# Altium footprint library smdComponent.PcbLib: 182 footprints (part 5 of 12)
Each footprint in its own frame and in the unit in brackets; x right, y up, seen from the top. Pads: shape width x height; smd on the part's side, far side on the other; paste and mask are expansions set on the pad; w line width, h text height; cw(c..) or ccw(c..) is an arc to the next point about the centre after c.
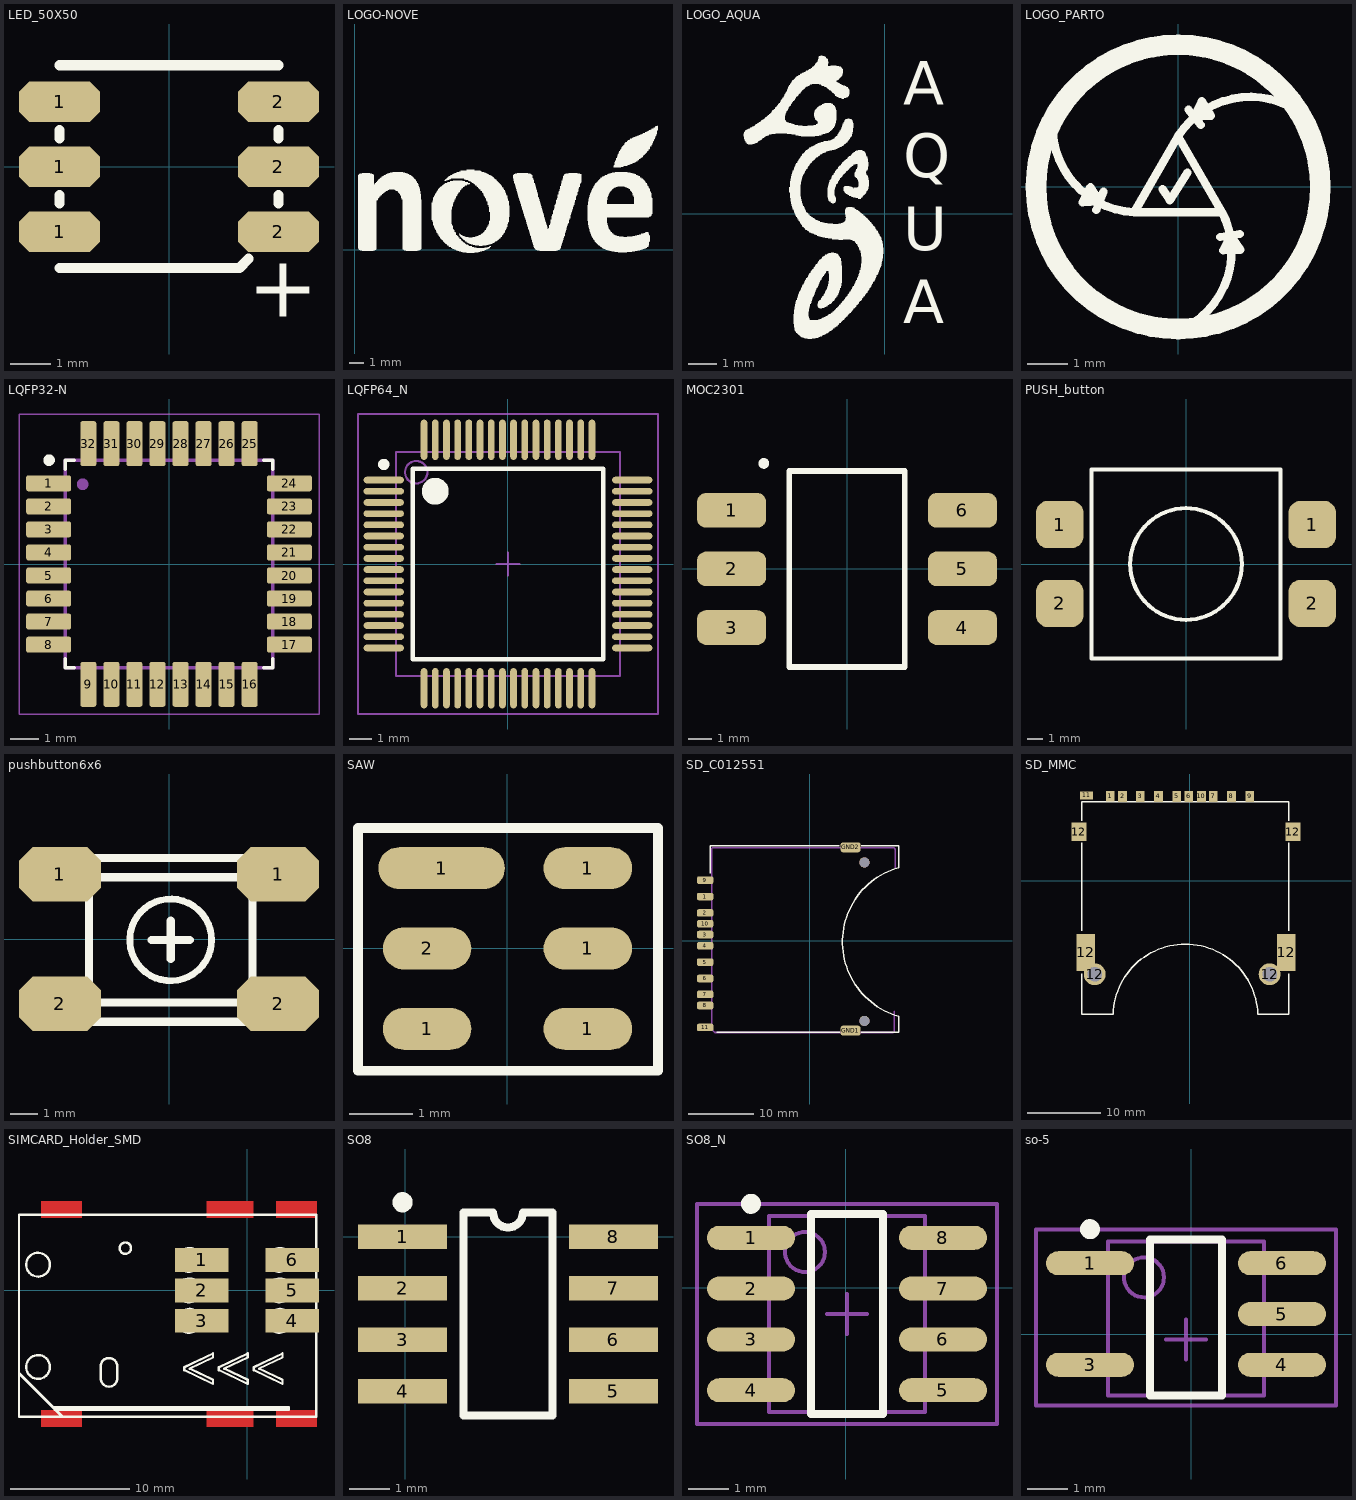
[diagram p4: the footprints below, top view; thin cyan lines are the x and y axes]

## LED_50X50 [mm] "SMD"
pads (6):
  oct 2x1 smd: 1(-2.7,-1.6) 1(-2.7,0) 1(-2.7,1.6) 2(2.7,-1.6) 2(2.7,0) 2(2.7,1.6)
Top Overlay:
  lines w0.254: -2.7,-2.5 1.734,-2.5 1.961,-2.273 ; -2.7,-0.9 -2.7,-0.7 ; -2.7,0.7 -2.7,0.9 ; -2.7,2.5 2.7,2.5 ; 2.7,-0.9 2.7,-0.7 ; 2.7,0.7 2.7,0.9
  text "+" at 1.946,-3.7 h1.52
3D body "LED_50X50.STEP": height 1.5, standoff -0.2, extent -2.708,-2.475 2.642,2.475

## LOGO-NOVE [mm]
Top Overlay:
  drawing of 1593 lines, arcs and shapes, not listed

## LOGO_AQUA [mm]
Top Overlay:
  drawing of 3 lines, arcs and shapes, not listed
  text "A" at 0.635,3.81 h1.52
  text "Q" at 0.635,1.27 h1.52
  text "U" at 0.635,-1.27 h1.52
  text "A" at 0.635,-3.81 h1.52

## LOGO_PARTO [mm]
Top Overlay:
  circle w0.508: c0,0 r3.5
  lines w0.203: -3.088,1.59 ccw(c-0.978,1.485) -1.083,-0.625 ; -2.013,-0.568 -1.836,-0.113 ; -0.387,-0.055 -0.203,-0.33 0.229,0.356 ; 0.167,-3.469 ccw(c-0.797,-1.59) 1.083,-0.625 ; 0.254,1.905 0.559,1.524 ; 1.038,-1.233 1.52,-1.16 ; 2.921,1.88 ccw(c1.775,0.104) 0,1.25 ; -1.083,-0.625 1.083,-0.625 ; -1.083,-0.625 0,1.25 ; 0,1.25 1.083,-0.625 ; -2.354,-0.383 -1.93,-0.356 -2.161,-0.008 -2.354,-0.383 ; 0.396,1.727 0.813,1.753 0.584,2.108 0.396,1.727 ; 1.109,-1.567 1.531,-1.547 1.295,-1.194 1.109,-1.567

## LQFP32-N [mm]
pads (32):
  rrect25% 1.56x0.55 smd: 1(-4.18,2.8) 2(-4.18,2) 3(-4.18,1.2) 4(-4.18,0.4) 5(-4.18,-0.4) 6(-4.18,-1.2) 7(-4.18,-2) 8(-4.18,-2.8) 17(4.18,-2.8) 18(4.18,-2) 19(4.18,-1.2) 20(4.18,-0.4) 21(4.18,0.4) 22(4.18,1.2) 23(4.18,2) 24(4.18,2.8)
  rrect25% 0.55x1.56 smd: 9(-2.8,-4.18) 10(-2,-4.18) 11(-1.2,-4.18) 12(-0.4,-4.18) 13(0.4,-4.18) 14(1.2,-4.18) 15(2,-4.18) 16(2.8,-4.18) 25(2.8,4.18) 26(2,4.18) 27(1.2,4.18) 28(0.4,4.18) 29(-0.4,4.18) 30(-1.2,4.18) 31(-2,4.18) 32(-2.8,4.18)
Top Overlay:
  circle w0.2: c-4.166,3.607 r0.1
  lines w0.127: -3.6,-3.3 -3.6,-3.6 -3.3,-3.6 ; -3.6,3.3 -3.6,3.6 -3.3,3.6 ; 3.3,-3.6 3.6,-3.6 3.6,-3.3 ; 3.3,3.6 3.6,3.6 3.6,3.3
Mechanical 13:
  circle w0.2: c-3,2.77 r0.1
  lines w0.127: -3.6,-3.6 3.6,-3.6 3.6,3.6 -3.6,3.6 -3.6,-3.6
Mechanical 15:
  lines w0.05: -5.21,-5.21 5.21,-5.21 5.21,5.21 -5.21,5.21 -5.21,-5.21
3D body "User Library-LQFP32.STEP": height 1.63, standoff -0.09, extent -4.496,-4.525 4.504,4.475

## LQFP64_N [mm] "for stm32f103"
pads (64):
  oval 1.8x0.3 smd: 1(-5.55,3.75) 2(-5.55,3.25) 3(-5.55,2.75) 4(-5.55,2.25) 5(-5.55,1.75) 6(-5.55,1.25) 7(-5.55,0.75) 8(-5.55,0.25) 9(-5.55,-0.25) 10(-5.55,-0.75) 11(-5.55,-1.25) 12(-5.55,-1.75) 13(-5.55,-2.25) 14(-5.55,-2.75) 15(-5.55,-3.25) 16(-5.55,-3.75) 33(5.55,-3.75) 34(5.55,-3.25) 35(5.55,-2.75) 36(5.55,-2.25) 37(5.55,-1.75) 38(5.55,-1.25) 39(5.55,-0.75) 40(5.55,-0.25) 41(5.55,0.25) 42(5.55,0.75) 43(5.55,1.25) 44(5.55,1.75) 45(5.55,2.25) 46(5.55,2.75) 47(5.55,3.25) 48(5.55,3.75)
  oval 0.3x1.8 smd: 17(-3.75,-5.55) 18(-3.25,-5.55) 19(-2.75,-5.55) 20(-2.25,-5.55) 21(-1.75,-5.55) 22(-1.25,-5.55) 23(-0.75,-5.55) 24(-0.25,-5.55) 25(0.25,-5.55) 26(0.75,-5.55) 27(1.25,-5.55) 28(1.75,-5.55) 29(2.25,-5.55) 30(2.75,-5.55) 31(3.25,-5.55) 32(3.75,-5.55) 49(3.75,5.55) 50(3.25,5.55) 51(2.75,5.55) 52(2.25,5.55) 53(1.75,5.55) 54(1.25,5.55) 55(0.75,5.55) 56(0.25,5.55) 57(-0.25,5.55) 58(-0.75,5.55) 59(-1.25,5.55) 60(-1.75,5.55) 61(-2.25,5.55) 62(-2.75,5.55) 63(-3.25,5.55) 64(-3.75,5.55)
Top Overlay:
  circle w0.25: c-5.55,4.45 r0.125
  circle w0.6: c-3.25,3.25 r0.3
  lines w0.2: -4.25,-4.25 -4.25,4.25 4.25,4.25 4.25,-4.25 -4.25,-4.25
Mechanical 13:
  circle w0.1: c-4.1,4.1 r0.5
  lines w0.1: -5,-5 -5,5 5,5 5,-5 -5,-5
Mechanical 15:
  lines w0.1: -0.5,0 0.5,0 ; 0,-0.5 0,0.5 ; -6.7,-6.7 -6.7,6.7 6.7,6.7 6.7,-6.7 -6.7,-6.7
3D body "STM32F107 -LQFP64 10mm x 10mm.step": height 1.6, standoff 0.01, extent -6.003,-5.994 5.994,6.003

## MOC2301 [mm]
pads (6):
  rrect50% 3x1.5 smd: 1(-5,2.54) 2(-5,0) 3(-5,-2.54) 4(5,-2.54) 5(5,0) 6(5,2.54)
Top Overlay:
  circle w0.254: c-3.607,4.572 r0.105
  lines w0.254: -2.501,-4.25 2.401,-4.25 ; -2.501,4.25 2.401,4.25 ; -2.5,-4.25 -2.5,4.25 ; 2.5,-4.25 2.5,4.25
3D body "moc3051.step": height 5.93, standoff 0, extent -4.925,-4.445 4.975,4.445

## PUSH_button [mm] "12x12 smd flat"
pads (4):
  rrect50% 3x3 smd: 1(-8,2.5) 1(8,2.5) 2(-8,-2.5) 2(8,-2.5)
Top Overlay:
  circle w0.254: c0,0 r3.536
  lines w0.254: -6,-6 -6,6 6,6 6,-6 -6,-6
3D body "SWT_12x12_SMD.step": height 4, standoff 0, extent -6.731,-6 6.719,6

## pushbutton6x6 [mm]
pads (4):
  oct 3x2 smd: 1(-4,2.375) 1(4,2.375) 2(-4,-2.375) 2(4,-2.375)
Top Overlay:
  circle w0.25: c0.061,-0.034 r1.5
  lines w0.3: -3.464,-2.334 3.561,-2.334 ; -3.464,2.266 3.561,2.266 ; -0.639,-0.034 0.761,-0.034 ; 0.061,-0.734 0.061,0.666 ; -2.939,-3.034 3.061,-3.034 3.061,2.966 -2.939,2.966 -2.939,-3.034
3D body "User Library-KFC-A06-HA-4_3.STEP": height 4.3, standoff 0, extent -4.397,-2.999 4.603,3.001

## SAW [mm]
pads (6):
  oval 1.4x0.665 smd: 1(-1.27,-1.27) 1(1.27,-1.27) 1(1.27,0) 1(1.27,1.27) 2(-1.27,0)
  oval 2x0.665 smd: 1(-1.041,1.27)
Top Overlay:
  lines w0.152: -2.362,-1.93 2.379,-1.93 2.379,1.905 -2.362,1.905 -2.362,-1.93
3D body "saw.STEP": height 1.14, standoff -0.09, extent -1.525,-1.473 1.475,1.527

## SD_C012551 [mm]
pads (15):
  rrect50% 2.5x1.16 smd: 1(-15.96,6.734) 2(-15.96,4.234) 3(-15.96,0.934) 4(-15.96,-0.776) 5(-15.96,-3.276) 6(-15.96,-5.776) 7(-15.96,-8.196) 8(-15.96,-9.896) 9(-15.96,9.234) 10(-15.96,2.584) 11(-15.96,-13.246)
  rrect50% 3.048x1.524 smd: GND1(6.24,-13.746) GND2(6.24,14.254)
  round 1.55 hole 1.55 unplated: MH1(8.34,-12.246) MH2(8.34,11.954)
Top Overlay:
  lines w0.2: -15.21,10.254 -15.21,14.474 4.49,14.474 ; -14.21,-13.966 4.59,-13.966 ; 7.89,-13.966 13.59,-13.966 13.59,-11.545 cw(c16.79,-0.187) 13.586,11.169 13.586,14.47 13.581,14.474 7.89,14.474
Mechanical 1:
  lines w0.254: -14.956,-13.559 -14.956,14.102
Mechanical 13:
  lines w0.254: -14.956,-13.559 -14.494,-14.021 12.776,-14.021 12.929,-13.868 12.929,-10.77 ; -14.834,14.173 12.852,14.173 13.056,13.97 13.056,11.125
3D body: height 2.38, standoff 0, extent -16.236,-13.049 -15.278,-12.851
3D body: height 2.4, standoff 2, extent -16.236,-13.045 -13.053,-12.854
3D body: height 2.4, standoff 2, extent -15.806,-10.165 -12.623,-9.572
3D body: height 2.38, standoff 0, extent -15.806,-10.165 -15.185,-9.572
3D body: height 0.3, standoff 0, extent -16.286,-10.165 -15.368,-9.577
3D body: height 2.4, standoff 2, extent -15.806,-8.528 -12.623,-7.935
3D body: height 2.38, standoff 0, extent -15.806,-8.528 -15.185,-7.935
3D body: height 0.3, standoff 0, extent -16.286,-8.528 -15.368,-7.94
3D body: height 2.4, standoff 2, extent -15.865,-6.065 -12.682,-5.472
3D body: height 2.38, standoff 0, extent -15.865,-6.065 -15.244,-5.472
3D body: height 0.3, standoff 0, extent -16.345,-6.065 -15.427,-5.477
3D body: height 2.4, standoff 2, extent -15.865,-3.513 -12.682,-2.92
3D body: height 2.38, standoff 0, extent -15.865,-3.513 -15.244,-2.92
3D body: height 0.3, standoff 0, extent -16.345,-3.513 -15.427,-2.925
3D body: height 2.4, standoff 2, extent -15.894,-1.08 -12.711,-0.487
3D body: height 2.38, standoff 0, extent -15.894,-1.08 -15.273,-0.487
3D body: height 0.3, standoff 0, extent -16.374,-1.08 -15.456,-0.492
3D body: height 2.4, standoff 2, extent -15.909,0.602 -12.726,1.195
3D body: height 2.38, standoff 0, extent -15.909,0.602 -15.288,1.195
3D body: height 0.3, standoff 0, extent -16.389,0.602 -15.471,1.19
3D body: height 2.4, standoff 2, extent -16.071,2.239 -12.888,2.832
3D body: height 2.38, standoff 0, extent -16.071,2.239 -15.45,2.832
3D body: height 0.3, standoff 0, extent -16.551,2.239 -15.633,2.827
3D body: height 2.4, standoff 2, extent -15.924,3.935 -12.741,4.528
3D body: height 2.38, standoff 0, extent -15.924,3.935 -15.303,4.528
3D body: height 0.3, standoff 0, extent -16.404,3.935 -15.486,4.523
3D body: height 2.4, standoff 2, extent -15.968,6.398 -12.785,6.991
3D body: height 2.38, standoff 0, extent -15.968,6.398 -15.347,6.991
3D body: height 0.3, standoff 0, extent -16.448,6.398 -15.53,6.986
3D body: height 2.8, standoff 0, extent -12.927,-13.968 -11.979,-13.743
3D body: height 2.8, standoff 0, extent 5.598,14.254 6.625,14.57
3D body: height 2.8, standoff 0, extent 5.059,-13.96 7.511,-13.536
3D body: height 2, standoff 0, extent 3.961,13.851 12.475,14.108
3D body: height 2.9, standoff 0, extent -14.941,13.713 3.994,14.118
3D body: height 2.9, standoff 0, extent -15.025,2.219 -13.739,6.637
3D body: height 2.9, standoff 0, extent -14.976,-4.409 -13.66,-0.876
3D body: height 2.9, standoff 0, extent -15.098,-12.795 -13.468,-8.558
3D body: height 2.8, standoff 0, extent -14.956,-13.697 -13.819,13.773
3D body: height 2, standoff 0.3, extent -11.98,-14.065 12.593,-13.698
3D body: height 0.3, standoff 0, extent -16.412,8.924 -15.494,9.512
3D body: height 2.38, standoff 0, extent -15.932,8.924 -15.311,9.517
3D body: height 2.4, standoff 2, extent -15.932,8.924 -12.749,9.517
3D body: height 0.3, standoff 0, extent -16.216,-13.7 -15.273,-12.854
3D body "SD card.stp": height 2.23, standoff 0.13, extent -14.281,-11.658 17.719,12.342
3D body: height 0.89, standoff 0.03, extent -14.836,-13.905 12.875,14.213
3D body: height 2.9, standoff 2.59, extent -14.681,-14.148 13.208,14.224

## SD_MMC [mm]
height 0.051
pads (17):
  rect 1.2x1.5 smd: 1(-10.871,11.582) 2(-9.183,11.562) 3(-6.763,11.562) 4(-4.263,11.562) 5(-1.763,11.562) 6(-0.127,11.557) 7(3.237,11.562) 8(5.737,11.562) 9(8.237,11.562) 10(1.626,11.562)
  rect 1.778x1.1 smd: 11(-14.097,11.684)
  rect 2x2.5 smd: 12(-15.143,6.712) 12(14.157,6.712)
  rect 2.54x5.08 smd: 12(-14.243,-9.799) 12(13.259,-9.799)
  round 3 hole 2 unplated: 12(-12.989,-12.788) 12(10.957,-12.788)
Top Overlay:
  lines w0.203: -14.743,-12.7 -14.743,-18.288 -10.483,-18.288 cw(c-0.573,-18.585) 9.337,-18.288 13.607,-18.288 13.607,-12.7 ; -14.743,-6.858 -14.743,0.712 ; -14.743,0.508 -14.743,2.212 -14.743,5.212 ; -14.743,8.212 -14.743,10.812 13.607,10.812 13.607,8.212 ; 13.589,-6.858 13.607,5.212
3D body "socket_a-sd-09-c-a-1-3.stp": height 2.65, standoff -0.7, extent -15.35,-18.25 13.45,12.05

## SIMCARD_Holder_SMD [mm] "Kheshbi"
height 1.4
pads (6):
  rect 4.5x2 smd: 1(-3.802,2.56) 2(-3.802,0) 3(-3.802,-2.56) 4(3.796,-2.56) 5(3.796,0) 6(3.802,2.56)
Top Layer:
  rectangle: 2.457,-11.486 5.881,-10.06
  rectangle: -3.418,-11.486 0.535,-10.06
  rectangle: -17.302,-11.486 -13.878,-10.06
  rectangle: -17.307,6.086 -13.883,7.512
  rectangle: -3.424,6.086 0.529,7.512
  rectangle: 2.452,6.086 5.875,7.512
Top Overlay:
  circle w0.2: c2.73,2.559 r1
  circle w0.2: c2.73,-0.001 r1
  circle w0.2: c2.73,-2.561 r1
  circle w0.2: c-4.87,2.559 r1
  circle w0.2: c-4.87,-0.001 r1
  circle w0.2: c-4.87,-2.561 r1
  circle w0.2: c-17.57,2.159 r1
  circle w0.2: c-10.232,3.547 r0.48
  circle w0.2: c-17.57,-6.441 r1
  lines w0.2: -19.17,-10.641 -19.17,6.359 5.83,6.359 5.83,-10.641 -19.17,-10.641 ; -16.151,-10.044 3.515,-10.044 3.515,-9.826 -16.151,-9.826 -16.151,-10.044 ; -12.304,-7.39 ccw(c-11.606,-7.39) -10.907,-7.39 -10.907,-6.392 ccw(c-11.606,-6.392) -12.304,-6.392 -12.304,-7.39 ; -5.278,-6.704 -5.278,-6.459 -2.855,-5.302 -2.855,-5.644 -4.819,-6.581 -2.855,-7.519 -2.855,-7.86 -5.278,-6.704 ; -2.361,-6.704 -2.361,-6.459 0.062,-5.302 0.062,-5.644 -1.903,-6.581 0.062,-7.519 0.062,-7.86 -2.361,-6.704 ; 0.555,-6.704 0.555,-6.459 2.978,-5.302 2.978,-5.644 1.014,-6.581 2.978,-7.519 2.978,-7.86 0.555,-6.704
  lines w0.254: -19.127,-7.02 -15.56,-10.587
Top Solder:
  rectangle: -17.307,6.086 -13.883,7.512
  rectangle: -3.424,6.086 0,7.512
  rectangle: 2.452,6.086 5.876,7.512
  rectangle: 2.457,-11.486 5.881,-10.06
  rectangle: -3.418,-11.486 0.006,-10.06
  rectangle: -17.302,-11.486 -13.878,-10.06
3D body "SIMCARD Holder.STEP": height 1.52, standoff 0.01, extent -19.17,-10.655 5.83,6.345

## SO8 [mm]
pads (8):
  rect 2.2x0.6 smd: 1(-0.06,0) 2(-0.06,-1.27) 3(-0.06,-2.54) 4(-0.06,-3.81) 5(5.14,-3.81) 6(5.14,-2.54) 7(5.14,-1.27) 8(5.14,0)
Top Overlay:
  circle w0.25: c-0.06,0.85 r0.125
  lines w0.2: 1.44,-4.405 1.44,0.595 2.173,0.595 ccw(c2.54,0.595) 2.907,0.595 3.64,0.595 3.64,-4.405 1.44,-4.405

## SO8_N [mm]
pads (8):
  oval 2.2x0.6 smd: 1(-2.375,1.245) 2(-2.375,-0.025) 3(-2.375,-1.295) 4(-2.375,-2.565) 5(2.425,-2.565) 6(2.425,-1.295) 7(2.425,-0.025) 8(2.425,1.245)
Top Overlay:
  circle w0.25: c-2.375,2.095 r0.125
  lines w0.2: -0.875,-3.16 0.925,-3.16 0.925,1.84 -0.875,1.84 -0.875,-3.16
Mechanical 13:
  circle w0.1: c-1.025,0.89 r0.5
  lines w0.1: -1.925,-3.11 1.975,-3.11 1.975,1.79 -1.925,1.79 -1.925,-3.11
Mechanical 15:
  lines w0.1: -0.475,-0.66 0.525,-0.66 ; 0.025,-1.16 0.025,-0.16 ; -3.725,-3.41 3.775,-3.41 3.775,2.09 -3.725,2.09 -3.725,-3.41

## so-5 [mm]
pads (5):
  oval 2.2x0.6 smd: 1(-2.527,1.778) 3(-2.527,-0.762) 4(2.273,-0.762) 5(2.273,0.508) 6(2.273,1.778)
Top Overlay:
  circle w0.25: c-2.527,2.628 r0.125
  lines w0.2: -1.027,-1.524 0.773,-1.524 0.773,2.373 -1.027,2.373 -1.027,-1.524
Mechanical 13:
  circle w0.1: c-1.177,1.423 r0.5
  lines w0.1: -2.077,-1.524 1.823,-1.524 1.823,2.323 -2.077,2.323 -2.077,-1.524
Mechanical 15:
  lines w0.1: -0.627,-0.127 0.373,-0.127 ; -0.127,-0.627 -0.127,0.373 ; -3.877,-1.778 3.623,-1.778 3.623,2.623 -3.877,2.623 -3.877,-1.778
3D body: height 1.75, standoff 0, extent -2.077,-1.524 1.823,2.323